# Altium footprint library bldc.PcbLib: 62 footprints (part 2 of 4)
Each footprint in its own frame and in the unit in brackets; x right, y up, seen from the top. Pads: shape width x height; smd on the part's side, far side on the other; paste and mask are expansions set on the pad; w line width, h text height; cw(c..) or ccw(c..) is an arc to the next point about the centre after c.
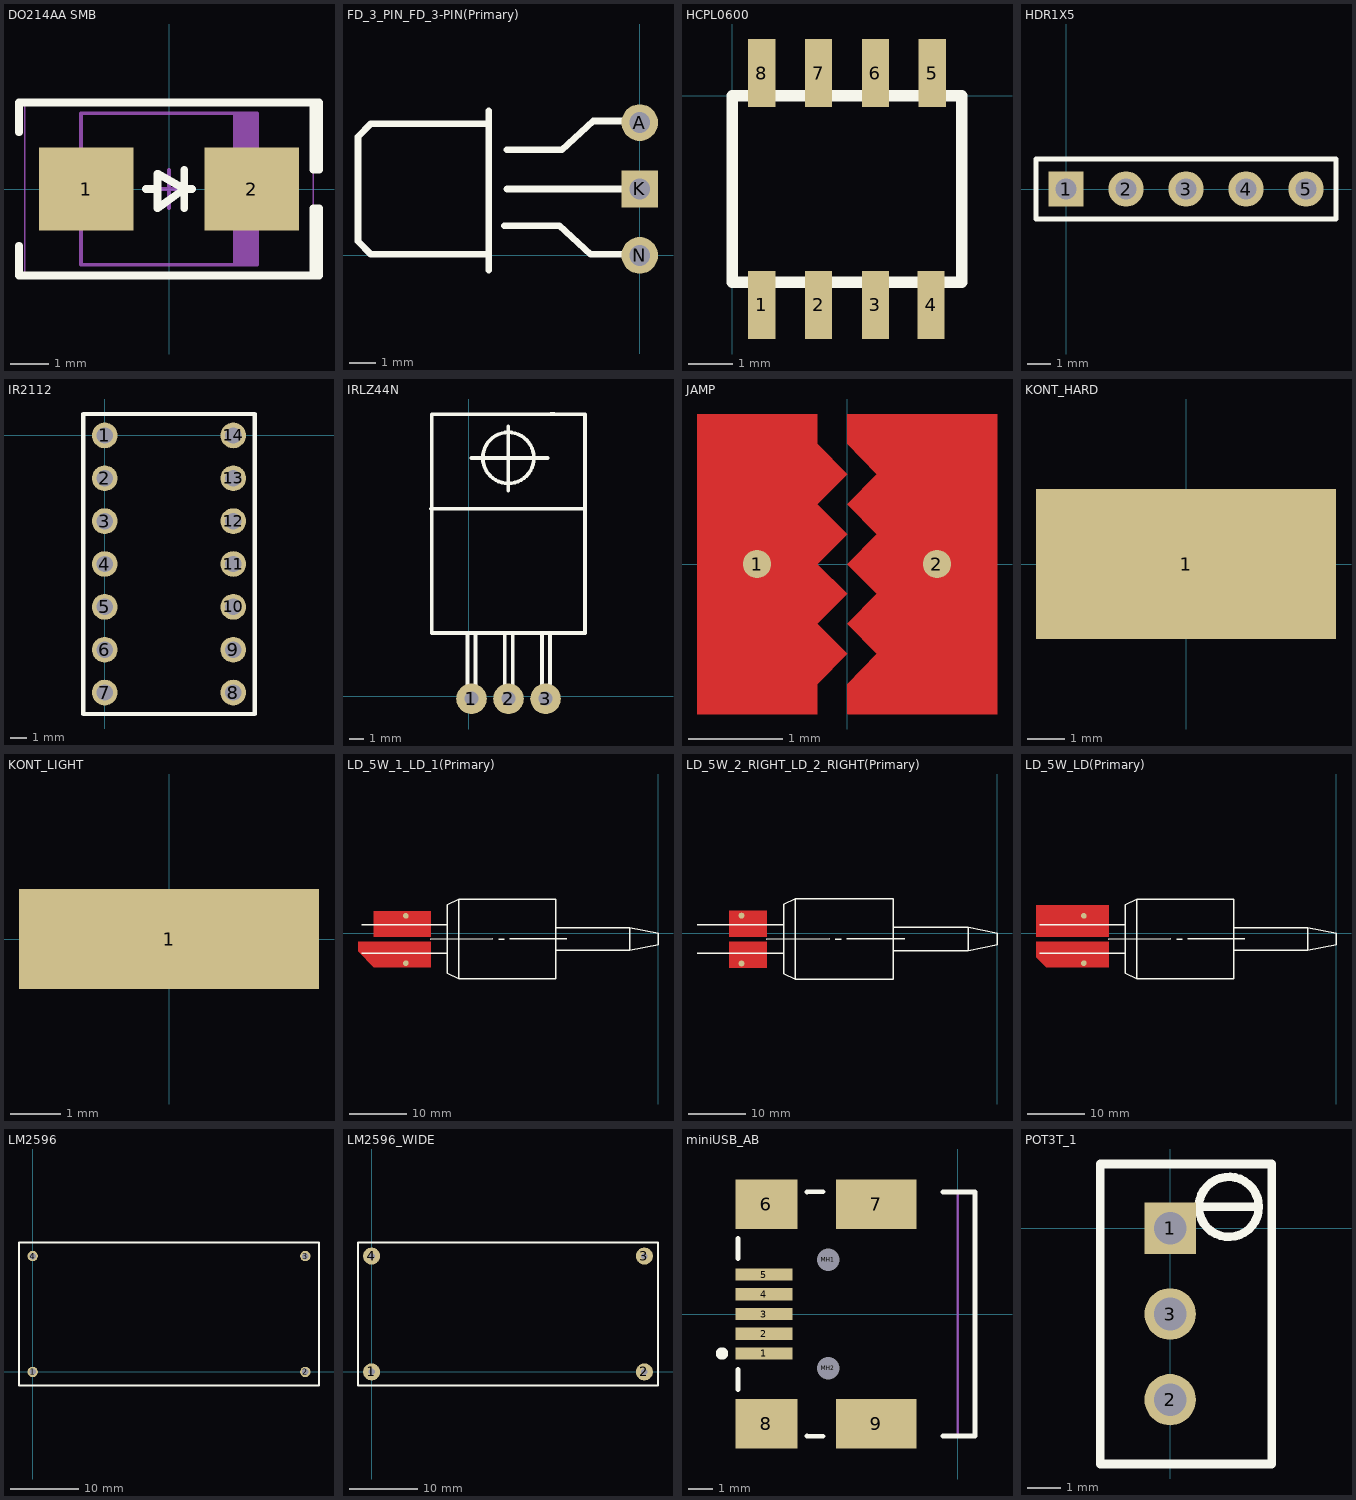
[diagram p1: the footprints below, top view; thin cyan lines are the x and y axes]

## DO214AA SMB [mm] "Molded Diode, 2-Leads, Body 4.31x3.62mm, IPC Medium Density"
height 2.44
pads (2):
  rect 2.45x2.15 smd: 1(-2.15,0) 2(2.15,0)
Top Overlay:
  lines w0.2: -3.9,-1.475 -3.9,-2.25 3.9,-2.25 3.9,-0.5 3.75,-0.5 3.75,-2.25 ; -3.9,1.475 -3.9,2.25 3.9,2.25 3.9,0.5 3.75,0.5 3.75,2.25 ; -0.6,0 -0.3,0 ; 0.4,-0.5 0.4,0.5 ; 0.6,0 0.4,0 ; 0.4,0 -0.3,-0.5 -0.3,0.4 0.4,0
Mechanical 13:
  rectangle: 1.67,-1.97 2.285,1.97
  lines w0.1: -2.285,-1.97 -2.285,1.97 2.285,1.97 2.285,-1.97 -2.285,-1.97
Mechanical 15:
  lines w0.05: -3.75,-2.25 -3.75,2.25 3.75,2.25 3.75,-2.25 -3.75,-2.25
  lines w0.1: -0.5,0 0.5,0 ; 0,-0.5 0,0.5
3D body "SMB.STEP": height 2.4, standoff 0, extent -2.6,-1.799 2.6,1.8

## FD_3_PIN_FD_3-PIN(Primary) [mm]
pads (3):
  round 1.4 hole 0.8: A(0,5.08) N(0,0)
  rect 1.4x1.4 hole 0.8: K(0,2.54)
Top Overlay:
  lines w0.254: -5.78,-0.56 -5.78,5.54 ; -5.78,0.04 -10.28,0.04 -10.78,0.54 -10.78,4.54 -10.28,5.04 -5.78,5.04 ; -5.18,1.14 -3.08,1.14 -1.88,0.04 -0.08,0.04 ; -5.08,2.54 0,2.54 ; -5.08,4.04 -2.98,4.04 -1.78,5.14 0.02,5.14

## HCPL0600 [mil]
pads (8):
  rect 24x60 smd: 1(26,-184) 2(76,-184) 3(126,-184) 4(175,-184) 5(176,20) 6(126,20) 7(76,20) 8(26,20)
Top Overlay:
  lines w10: 0,-164 0,0 202,0 202,-164 0,-164
3D body: height 143, standoff 0, extent 0,-164 202,0

## HDR1X5 [mm] "Connector; Header; 5 Position"
pads (5):
  rect 1.5x1.5 hole 0.9: 1(0,0)
  round 1.5 hole 0.9: 2(2.54,0) 3(5.08,0) 4(7.62,0) 5(10.16,0)
Top Overlay:
  lines w0.2: -1.27,-1.27 11.43,-1.27 11.43,1.27 -1.27,1.27 -1.27,-1.27

## IR2112 [mil]
pads (14):
  round 60 hole 38: 1(0,0) 2(0,-100) 3(0,-200) 4(0,-300) 5(0,-400) 6(0,-500) 7(0,-600) 8(300,-600) 9(300,-500) 10(300,-400) 11(300,-300) 12(300,-200) 13(300,-100) 14(300,0)
Top Overlay:
  lines w10: -50,-650 -50,50 350,50 350,-650 -50,-650

## IRLZ44N [mm]
pads (3):
  round 2.1 hole 0.965: 1(0.17,-0.17) 2(2.71,-0.17) 3(5.25,-0.17)
Top Overlay:
  circle w0.254: c2.7,16.34 r1.75
  lines w0.254: -2.6,12.85 7.95,12.85 ; -2.55,4.34 7.95,4.34 ; -2.55,4.35 -2.55,19.34 7.95,19.34 7.95,4.35 ; -0.1,0.55 -0.1,4.35 ; 0.15,16.34 5.4,16.34 ; 0.45,0.55 0.45,4.35 ; 2.45,0.55 2.45,4.35 ; 2.65,16.34 2.7,16.34 ; 2.7,14.1 2.7,18.5 ; 3,0.55 3,4.35 ; 5,0.55 5,4.35 ; 5.55,0.55 5.55,4.35 ; 5.6,19.35 5.8,19.35 5.85,19.35
3D body "TO-220-H.stp": height 4.7, standoff -3.5, extent -2.56,-0.45 7.98,19.32

## JAMP [mm]
pads (2):
  round 0.3 smd: 1(-0.951,0) 2(0.951,0)
Top Layer:
  region: 0,1.268 0.317,0.951 0,0.634 0.317,0.317 0,0 0.317,-0.317 0,-0.634 0.317,-0.951 0,-1.268 0,-1.585 1.585,-1.585 1.585,1.585 0,1.585
  region: -1.585,-1.585 -0.317,-1.585 -0.317,-1.268 0,-0.951 -0.317,-0.634 0,-0.317 -0.317,0 0,0.317 -0.317,0.634 0,0.951 -0.317,1.268 -0.317,1.585 -1.585,1.585

## KONT_HARD [mm]
pads (1):
  rect 8x4 smd: 1(0,0)

## KONT_LIGHT [mm]
pads (1):
  rect 6x2 smd: 1(0,0)

## LD_5W_1_LD_1(Primary) [mm]
pads (2):
  round 1 smd: A(-44.289,3.044) K(-44.289,-5.256)
Top Layer:
  region: -39.9,3.9 -49.9,3.9 -49.9,-0.6 -39.9,-0.6
  region: -39.9,-1.5 -52.7,-1.5 -52.7,-3.2 -49.9,-6 -39.9,-6
Top Overlay:
  lines w0.254: -52.002,-3.516 -37.002,-3.516 ; -52.002,1.484 -37.002,1.484 ; -40.002,-1.016 -29.002,-1.016 ; -28.002,-1.016 -27.002,-1.016 ; -26.002,-1.016 -16.002,-1.016 ; -18.002,-3.016 -5.002,-3.016 ; -18.002,0.984 -5.002,0.984 ; -35.002,-8.016 -37.002,-7.016 -37.002,4.984 -35.002,5.984 ; -35.002,-8.016 -35.002,5.984 ; -35.002,-8.016 -18.002,-8.016 -18.002,5.984 -35.002,5.984 ; -5.002,-3.016 -5.002,0.984 ; -5.002,-3.016 -0.002,-2.016 -0.002,-0.016 -5.002,0.984

## LD_5W_2_RIGHT_LD_2_RIGHT(Primary) [mm]
pads (2):
  round 1 smd: A(-44.289,3.044) K(-44.289,-5.256)
Top Layer:
  region: -39.9,-1.5 -46.4,-1.5 -46.4,-6 -39.9,-6
  region: -39.9,3.9 -46.4,3.9 -46.4,-0.6 -39.9,-0.6
Top Overlay:
  lines w0.254: -52.002,-3.516 -37.002,-3.516 ; -52.002,1.484 -37.002,1.484 ; -40.002,-1.016 -29.002,-1.016 ; -28.002,-1.016 -27.002,-1.016 ; -26.002,-1.016 -16.002,-1.016 ; -18.002,-3.016 -5.002,-3.016 ; -18.002,0.984 -5.002,0.984 ; -35.002,-8.016 -37.002,-7.016 -37.002,4.984 -35.002,5.984 ; -35.002,-8.016 -35.002,5.984 ; -35.002,-8.016 -18.002,-8.016 -18.002,5.984 -35.002,5.984 ; -5.002,-3.016 -5.002,0.984 ; -5.002,-3.016 -0.002,-2.016 -0.002,-0.016 -5.002,0.984

## LD_5W_LD(Primary) [mm]
pads (2):
  round 1 smd: A(-44.289,3.044) K(-44.289,-5.256)
Top Layer:
  region: -39.9,-1.5 -52.7,-1.5 -52.7,-4.2 -50.9,-6 -39.9,-6
  region: -39.9,4.9 -52.7,4.9 -52.7,-0.6 -39.9,-0.6
Top Overlay:
  lines w0.254: -52.002,-3.516 -37.002,-3.516 ; -52.002,1.484 -37.002,1.484 ; -40.002,-1.016 -29.002,-1.016 ; -28.002,-1.016 -27.002,-1.016 ; -26.002,-1.016 -16.002,-1.016 ; -18.002,-3.016 -5.002,-3.016 ; -18.002,0.984 -5.002,0.984 ; -35.002,-8.016 -37.002,-7.016 -37.002,4.984 -35.002,5.984 ; -35.002,-8.016 -35.002,5.984 ; -35.002,-8.016 -18.002,-8.016 -18.002,5.984 -35.002,5.984 ; -5.002,-3.016 -5.002,0.984 ; -5.002,-3.016 -0.002,-2.016 -0.002,-0.016 -5.002,0.984

## LM2596 [mil]
pads (4):
  round 60 hole 38: 1(0,0) 2(1574.8,0) 3(1574.8,669.29) 4(0,669.29)
Top Overlay:
  lines w10: -78.74,-78.74 -78.74,748.03 1653.54,748.03 1653.54,-78.74 -78.74,-78.74

## LM2596_WIDE [mm]
pads (4):
  round 2.5 hole 0.965: 1(0,0) 2(40,0) 3(40,17) 4(0,17)
Top Overlay:
  lines w0.254: -2,-2 42,-2 42,19 -2,19 -2,-2
3D body "Step Down voltage regulator LM2596.stp": height 12.7, standoff -1, extent -1.434,-2.091 41.566,19.109

## miniUSB_AB [mm] "Connector; USB2.0, Type AB, SM; 5 Position; Right Angle"
height 3.9
pads (11):
  rect 2.3x0.5 smd: 1(-7.85,-1.6) 2(-7.85,-0.8) 3(-7.85,0) 4(-7.85,0.8) 5(-7.85,1.6)
  rect 2.5x2 smd: 6(-7.75,4.45) 8(-7.75,-4.45)
  rect 3.262x2 smd: 7(-3.302,4.445) 9(-3.302,-4.445)
  round 0.6 hole 0.9 unplated: MH1(-5.25,2.2) MH2(-5.25,-2.2)
Top Overlay:
  circle w0.25: c-9.55,-1.6 r0.125
  lines w0.2: -8.9,-3.05 -8.9,-2.25 ; -8.9,2.25 -8.9,3.05 ; -6.1,-4.95 -5.461,-4.953 ; -6.1,4.95 -5.461,4.953 ; -0.6,-4.95 0.7,-4.95 0.7,4.95 -0.6,4.95
Mechanical 1:
  lines w0.1: 0,-4.95 0,4.95
  text "PCB Edge" at 0.432,-4.036 h0.25
3D body "MOLEX_0678038020.STEP": height 4, standoff -0.95, extent -8.294,-4.95 0.706,4.95

## POT3T_1 [mil]
pads (3):
  rect 60x60 hole 38: 1(0,0)
  round 60 hole 38: 2(0,-200) 3(0,-100)
Top Overlay:
  circle w10: c68.5,25 r35
  lines w10: 33.5,25 103.5,25 ; -81.5,-275 118.5,-275 118.5,75 -81.5,75 -81.5,-275